# Altium schematic symbol library Regulator_Switching.SchLib: 1070 symbols (part 8 of 9) (continued)
## TPS62130A
designator *  value TPS62130A
ki_keywords: step-down dcdc; ki_description: 3A Step-Down Converter with DCS-Control, Adjustable Output Voltage, 3-17V Input Voltage, PG=LOW in Power-Down, QFN-16; ki_fp_filters: VQFN*1EP*3x3mm*P0.5mm*; Footprint: Package_DFN_QFN:VQFN-16-1EP_3x3mm_P0.5mm_EP1.68x1.68mm_ThermalVias; Supplier: http://www.ti.com/lit/ds/symlink/tps62130.pdf
footprint VQFN-16-1EP_3x3mm_P0.5mm_EP1.68x1.68mm_ThermalVias
pins: 1 SW (out), 2 SW hidden, 3 SW hidden, 4 PG (oc), 5 FB (in), 6 AGND (power), 7 FSW (in), 8 DEF (in), 9 SS/TR (in), 10 AVIN (power), 11 PVIN (power), 12 PVIN hidden, 13 EN (in), 14 VOS (in), 15 PGND (power), 16 PGND hidden, 17 EP (power)

## TPS62131
designator *  value TPS62131
ki_keywords: step-down dcdc; ki_description: 3A Step-Down Converter with DCS-Control, Fixed 1.8V Output Voltage, 3-17V Input Voltage, QFN-16; ki_fp_filters: VQFN*1EP*3x3mm*P0.5mm*; Footprint: Package_DFN_QFN:VQFN-16-1EP_3x3mm_P0.5mm_EP1.68x1.68mm_ThermalVias; Supplier: http://www.ti.com/lit/ds/symlink/tps62130.pdf
footprint VQFN-16-1EP_3x3mm_P0.5mm_EP1.68x1.68mm_ThermalVias
pins: 1 SW (out), 2 SW hidden, 3 SW hidden, 4 PG (oc), 5 FB (in), 6 AGND (power), 7 FSW (in), 8 DEF (in), 9 SS/TR (in), 10 AVIN (power), 11 PVIN (power), 12 PVIN hidden, 13 EN (in), 14 VOS (in), 15 PGND (power), 16 PGND hidden, 17 EP (power)

## TPS62132
designator *  value TPS62132
ki_keywords: step-down dcdc; ki_description: 3A Step-Down Converter with DCS-Control, Fixed 3.3V Output Voltage, 3-17V Input Voltage, QFN-16; ki_fp_filters: VQFN*1EP*3x3mm*P0.5mm*; Footprint: Package_DFN_QFN:VQFN-16-1EP_3x3mm_P0.5mm_EP1.68x1.68mm_ThermalVias; Supplier: http://www.ti.com/lit/ds/symlink/tps62130.pdf
footprint VQFN-16-1EP_3x3mm_P0.5mm_EP1.68x1.68mm_ThermalVias
pins: 1 SW (out), 2 SW hidden, 3 SW hidden, 4 PG (oc), 5 FB (in), 6 AGND (power), 7 FSW (in), 8 DEF (in), 9 SS/TR (in), 10 AVIN (power), 11 PVIN (power), 12 PVIN hidden, 13 EN (in), 14 VOS (in), 15 PGND (power), 16 PGND hidden, 17 EP (power)

## TPS62133
designator *  value TPS62133
ki_keywords: step-down dcdc; ki_description: 3A Step-Down Converter with DCS-Control, Fixed 5.0V Output Voltage, 3-17V Input Voltage, QFN-16; ki_fp_filters: VQFN*1EP*3x3mm*P0.5mm*; Footprint: Package_DFN_QFN:VQFN-16-1EP_3x3mm_P0.5mm_EP1.68x1.68mm_ThermalVias; Supplier: http://www.ti.com/lit/ds/symlink/tps62130.pdf
footprint VQFN-16-1EP_3x3mm_P0.5mm_EP1.68x1.68mm_ThermalVias
pins: 1 SW (out), 2 SW hidden, 3 SW hidden, 4 PG (oc), 5 FB (in), 6 AGND (power), 7 FSW (in), 8 DEF (in), 9 SS/TR (in), 10 AVIN (power), 11 PVIN (power), 12 PVIN hidden, 13 EN (in), 14 VOS (in), 15 PGND (power), 16 PGND hidden, 17 EP (power)

## TPS62140
designator *  value TPS62140
ki_keywords: step-down dcdc; ki_description: 2A Step-Down Converter with DCS-Control, Adjustable Output Voltage, 3-17V Input Voltage, QFN-16; ki_fp_filters: VQFN*1EP*3x3mm*P0.5mm*; Footprint: Package_DFN_QFN:VQFN-16-1EP_3x3mm_P0.5mm_EP1.68x1.68mm_ThermalVias; Supplier: http://www.ti.com/lit/ds/symlink/TPS62140.pdf
footprint VQFN-16-1EP_3x3mm_P0.5mm_EP1.68x1.68mm_ThermalVias
pins: 1 SW (out), 2 SW hidden, 3 SW hidden, 4 PG (oc), 5 FB (in), 6 AGND (power), 7 FSW (in), 8 DEF (in), 9 SS/TR (in), 10 AVIN (power), 11 PVIN (power), 12 PVIN hidden, 13 EN (in), 14 VOS (in), 15 PGND (power), 16 PGND hidden, 17 EP (power)

## TPS62140A
designator *  value TPS62140A
ki_keywords: step-down dcdc; ki_description: 2A Step-Down Converter with DCS-Control, Adjustable Output Voltage, 3-17V Input Voltage, PG=LOW in Power-Down, QFN-16; ki_fp_filters: VQFN*1EP*3x3mm*P0.5mm*; Footprint: Package_DFN_QFN:VQFN-16-1EP_3x3mm_P0.5mm_EP1.68x1.68mm_ThermalVias; Supplier: http://www.ti.com/lit/ds/symlink/TPS62140.pdf
footprint VQFN-16-1EP_3x3mm_P0.5mm_EP1.68x1.68mm_ThermalVias
pins: 1 SW (out), 2 SW hidden, 3 SW hidden, 4 PG (oc), 5 FB (in), 6 AGND (power), 7 FSW (in), 8 DEF (in), 9 SS/TR (in), 10 AVIN (power), 11 PVIN (power), 12 PVIN hidden, 13 EN (in), 14 VOS (in), 15 PGND (power), 16 PGND hidden, 17 EP (power)

## TPS62141
designator *  value TPS62141
ki_keywords: step-down dcdc; ki_description: 2A Step-Down Converter with DCS-Control, Fixed 1.8V Output Voltage, 3-17V Input Voltage, QFN-16; ki_fp_filters: VQFN*1EP*3x3mm*P0.5mm*; Footprint: Package_DFN_QFN:VQFN-16-1EP_3x3mm_P0.5mm_EP1.68x1.68mm_ThermalVias; Supplier: http://www.ti.com/lit/ds/symlink/TPS62140.pdf
footprint VQFN-16-1EP_3x3mm_P0.5mm_EP1.68x1.68mm_ThermalVias
pins: 1 SW (out), 2 SW hidden, 3 SW hidden, 4 PG (oc), 5 FB (in), 6 AGND (power), 7 FSW (in), 8 DEF (in), 9 SS/TR (in), 10 AVIN (power), 11 PVIN (power), 12 PVIN hidden, 13 EN (in), 14 VOS (in), 15 PGND (power), 16 PGND hidden, 17 EP (power)

## TPS62142
designator *  value TPS62142
ki_keywords: step-down dcdc; ki_description: 2A Step-Down Converter with DCS-Control, Fixed 3.3V Output Voltage, 3-17V Input Voltage, QFN-16; ki_fp_filters: VQFN*1EP*3x3mm*P0.5mm*; Footprint: Package_DFN_QFN:VQFN-16-1EP_3x3mm_P0.5mm_EP1.68x1.68mm_ThermalVias; Supplier: http://www.ti.com/lit/ds/symlink/TPS62140.pdf
footprint VQFN-16-1EP_3x3mm_P0.5mm_EP1.68x1.68mm_ThermalVias
pins: 1 SW (out), 2 SW hidden, 3 SW hidden, 4 PG (oc), 5 FB (in), 6 AGND (power), 7 FSW (in), 8 DEF (in), 9 SS/TR (in), 10 AVIN (power), 11 PVIN (power), 12 PVIN hidden, 13 EN (in), 14 VOS (in), 15 PGND (power), 16 PGND hidden, 17 EP (power)

## TPS62143
designator *  value TPS62143
ki_keywords: step-down dcdc; ki_description: 2A Step-Down Converter with DCS-Control, Fixed 5.0V Output Voltage, 3-17V Input Voltage, QFN-16; ki_fp_filters: VQFN*1EP*3x3mm*P0.5mm*; Footprint: Package_DFN_QFN:VQFN-16-1EP_3x3mm_P0.5mm_EP1.68x1.68mm_ThermalVias; Supplier: http://www.ti.com/lit/ds/symlink/TPS62140.pdf
footprint VQFN-16-1EP_3x3mm_P0.5mm_EP1.68x1.68mm_ThermalVias
pins: 1 SW (out), 2 SW hidden, 3 SW hidden, 4 PG (oc), 5 FB (in), 6 AGND (power), 7 FSW (in), 8 DEF (in), 9 SS/TR (in), 10 AVIN (power), 11 PVIN (power), 12 PVIN hidden, 13 EN (in), 14 VOS (in), 15 PGND (power), 16 PGND hidden, 17 EP (power)

## TPS62150
designator *  value TPS62150
ki_keywords: step-down dcdc; ki_description: 1A Step-Down Converter with DCS-Control, Adjustable Output Voltage, 3-17V Input Voltage, QFN-16; ki_fp_filters: VQFN*1EP*3x3mm*P0.5mm*; Footprint: Package_DFN_QFN:VQFN-16-1EP_3x3mm_P0.5mm_EP1.68x1.68mm_ThermalVias; Supplier: http://www.ti.com/lit/ds/symlink/TPS62150.pdf
footprint VQFN-16-1EP_3x3mm_P0.5mm_EP1.68x1.68mm_ThermalVias
pins: 1 SW (out), 2 SW hidden, 3 SW hidden, 4 PG (oc), 5 FB (in), 6 AGND (power), 7 FSW (in), 8 DEF (in), 9 SS/TR (in), 10 AVIN (power), 11 PVIN (power), 12 PVIN hidden, 13 EN (in), 14 VOS (in), 15 PGND (power), 16 PGND hidden, 17 EP (power)

## TPS62150A
designator *  value TPS62150A
ki_keywords: step-down dcdc; ki_description: 1A Step-Down Converter with DCS-Control, Adjustable Output Voltage, 3-17V Input Voltage, PG=LOW in Power-Down, QFN-16; ki_fp_filters: VQFN*1EP*3x3mm*P0.5mm*; Footprint: Package_DFN_QFN:VQFN-16-1EP_3x3mm_P0.5mm_EP1.68x1.68mm_ThermalVias; Supplier: http://www.ti.com/lit/ds/symlink/TPS62150.pdf
footprint VQFN-16-1EP_3x3mm_P0.5mm_EP1.68x1.68mm_ThermalVias
pins: 1 SW (out), 2 SW hidden, 3 SW hidden, 4 PG (oc), 5 FB (in), 6 AGND (power), 7 FSW (in), 8 DEF (in), 9 SS/TR (in), 10 AVIN (power), 11 PVIN (power), 12 PVIN hidden, 13 EN (in), 14 VOS (in), 15 PGND (power), 16 PGND hidden, 17 EP (power)

## TPS62151
designator *  value TPS62151
ki_keywords: step-down dcdc; ki_description: 1A Step-Down Converter with DCS-Control, Fixed 1.8V Output Voltage, 3-17V Input Voltage, QFN-16; ki_fp_filters: VQFN*1EP*3x3mm*P0.5mm*; Footprint: Package_DFN_QFN:VQFN-16-1EP_3x3mm_P0.5mm_EP1.68x1.68mm_ThermalVias; Supplier: http://www.ti.com/lit/ds/symlink/TPS62150.pdf
footprint VQFN-16-1EP_3x3mm_P0.5mm_EP1.68x1.68mm_ThermalVias
pins: 1 SW (out), 2 SW hidden, 3 SW hidden, 4 PG (oc), 5 FB (in), 6 AGND (power), 7 FSW (in), 8 DEF (in), 9 SS/TR (in), 10 AVIN (power), 11 PVIN (power), 12 PVIN hidden, 13 EN (in), 14 VOS (in), 15 PGND (power), 16 PGND hidden, 17 EP (power)

## TPS62152
designator *  value TPS62152
ki_keywords: step-down dcdc; ki_description: 1A Step-Down Converter with DCS-Control, Fixed 3.3V Output Voltage, 3-17V Input Voltage, QFN-16; ki_fp_filters: VQFN*1EP*3x3mm*P0.5mm*; Footprint: Package_DFN_QFN:VQFN-16-1EP_3x3mm_P0.5mm_EP1.68x1.68mm_ThermalVias; Supplier: http://www.ti.com/lit/ds/symlink/TPS62150.pdf
footprint VQFN-16-1EP_3x3mm_P0.5mm_EP1.68x1.68mm_ThermalVias
pins: 1 SW (out), 2 SW hidden, 3 SW hidden, 4 PG (oc), 5 FB (in), 6 AGND (power), 7 FSW (in), 8 DEF (in), 9 SS/TR (in), 10 AVIN (power), 11 PVIN (power), 12 PVIN hidden, 13 EN (in), 14 VOS (in), 15 PGND (power), 16 PGND hidden, 17 EP (power)

## TPS62153
designator *  value TPS62153
ki_keywords: step-down dcdc; ki_description: 1A Step-Down Converter with DCS-Control, Fixed 5.0V Output Voltage, 3-17V Input Voltage, QFN-16; ki_fp_filters: VQFN*1EP*3x3mm*P0.5mm*; Footprint: Package_DFN_QFN:VQFN-16-1EP_3x3mm_P0.5mm_EP1.68x1.68mm_ThermalVias; Supplier: http://www.ti.com/lit/ds/symlink/TPS62150.pdf
footprint VQFN-16-1EP_3x3mm_P0.5mm_EP1.68x1.68mm_ThermalVias
pins: 1 SW (out), 2 SW hidden, 3 SW hidden, 4 PG (oc), 5 FB (in), 6 AGND (power), 7 FSW (in), 8 DEF (in), 9 SS/TR (in), 10 AVIN (power), 11 PVIN (power), 12 PVIN hidden, 13 EN (in), 14 VOS (in), 15 PGND (power), 16 PGND hidden, 17 EP (power)

## TPS62160DGK
designator *  value TPS62160DGK
ki_keywords: step-down dc-dc buck regulator; ki_description: 1A Step-Down Converter with DCS-Control, adjustable output, 3-17V input voltage, VSSOP-8; ki_fp_filters: MSOP*3x3mm*P0.65mm*; Footprint: Package_SO:MSOP-8_3x3mm_P0.65mm; Supplier: http://www.ti.com/lit/ds/symlink/tps62160.pdf
footprint MSOP-8_3x3mm_P0.65mm
pins: 1 PGND (power), 2 VIN (power), 3 EN (in), 4 AGND (power), 5 FB (in), 6 VOS (in), 7 SW (out), 8 PG (oc)

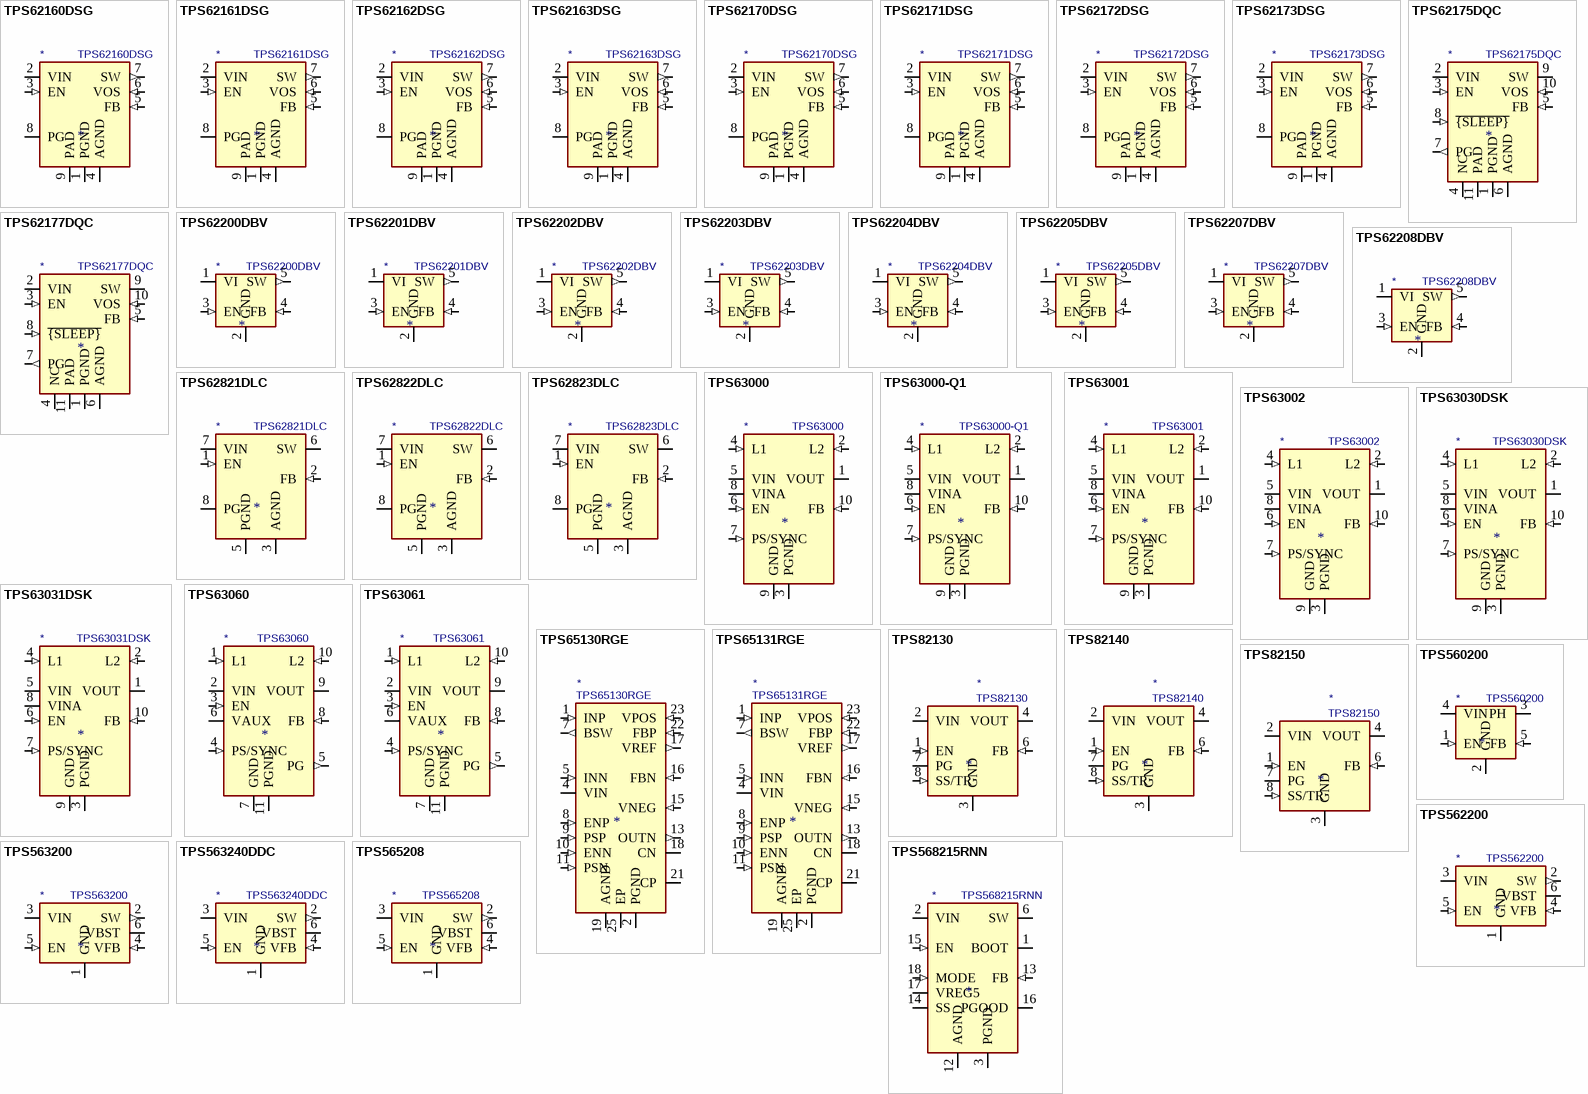
[diagram p25: symbols TPS62160DSG to TPS568215RNN]

## TPS62160DSG
designator *  value TPS62160DSG
ki_keywords: step-down dc-dc buck regulator; ki_description: 1A Step-Down Converter with DCS-Control, adjustable output, 3-17V input voltage, WSON-8; ki_fp_filters: WSON*EP*2x2mm*P0.5mm*; Footprint: Package_SON:WSON-8-1EP_2x2mm_P0.5mm_EP0.9x1.6mm_ThermalVias; Supplier: http://www.ti.com/lit/ds/symlink/tps62160.pdf
footprint WSON-8-1EP_2x2mm_P0.5mm_EP0.9x1.6mm_ThermalVias
pins: 1 PGND (power), 2 VIN (power), 3 EN (in), 4 AGND (power), 5 FB (in), 6 VOS (in), 7 SW (out), 8 PG (oc), 9 PAD (power)

## TPS62161DSG
designator *  value TPS62161DSG
ki_keywords: step-down dc-dc buck regulator; ki_description: 1A Step-Down Converter with DCS-Control, fixed 1.8V output, 3-17V input voltage, WSON-8; ki_fp_filters: WSON*EP*2x2mm*P0.5mm*; Footprint: Package_SON:WSON-8-1EP_2x2mm_P0.5mm_EP0.9x1.6mm_ThermalVias; Supplier: http://www.ti.com/lit/ds/symlink/tps62160.pdf
footprint WSON-8-1EP_2x2mm_P0.5mm_EP0.9x1.6mm_ThermalVias
pins: 1 PGND (power), 2 VIN (power), 3 EN (in), 4 AGND (power), 5 FB (in), 6 VOS (in), 7 SW (out), 8 PG (oc), 9 PAD (power)

## TPS62162DSG
designator *  value TPS62162DSG
ki_keywords: step-down dc-dc buck regulator; ki_description: 1A Step-Down Converter with DCS-Control, fixed 3.3V output, 3-17V input voltage, WSON-8; ki_fp_filters: WSON*EP*2x2mm*P0.5mm*; Footprint: Package_SON:WSON-8-1EP_2x2mm_P0.5mm_EP0.9x1.6mm_ThermalVias; Supplier: http://www.ti.com/lit/ds/symlink/tps62160.pdf
footprint WSON-8-1EP_2x2mm_P0.5mm_EP0.9x1.6mm_ThermalVias
pins: 1 PGND (power), 2 VIN (power), 3 EN (in), 4 AGND (power), 5 FB (in), 6 VOS (in), 7 SW (out), 8 PG (oc), 9 PAD (power)

## TPS62163DSG
designator *  value TPS62163DSG
ki_keywords: step-down dc-dc buck regulator; ki_description: 1A Step-Down Converter with DCS-Control, fixed 5.0V output, 3-17V input voltage, WSON-8; ki_fp_filters: WSON*EP*2x2mm*P0.5mm*; Footprint: Package_SON:WSON-8-1EP_2x2mm_P0.5mm_EP0.9x1.6mm_ThermalVias; Supplier: http://www.ti.com/lit/ds/symlink/tps62160.pdf
footprint WSON-8-1EP_2x2mm_P0.5mm_EP0.9x1.6mm_ThermalVias
pins: 1 PGND (power), 2 VIN (power), 3 EN (in), 4 AGND (power), 5 FB (in), 6 VOS (in), 7 SW (out), 8 PG (oc), 9 PAD (power)

## TPS62170DSG
designator *  value TPS62170DSG
ki_keywords: step-down dc-dc buck regulator; ki_description: 500mA Step-Down Converter with DCS-Control, adjustable output, 3-17V input voltage, WSON-8; ki_fp_filters: WSON*EP*2x2mm*P0.5mm*; Footprint: Package_SON:WSON-8-1EP_2x2mm_P0.5mm_EP0.9x1.6mm_ThermalVias; Supplier: http://www.ti.com/lit/ds/symlink/tps62170.pdf
footprint WSON-8-1EP_2x2mm_P0.5mm_EP0.9x1.6mm_ThermalVias
pins: 1 PGND (power), 2 VIN (power), 3 EN (in), 4 AGND (power), 5 FB (in), 6 VOS (in), 7 SW (out), 8 PG (oc), 9 PAD (power)

## TPS62171DSG
designator *  value TPS62171DSG
ki_keywords: step-down dc-dc buck regulator; ki_description: 500mA Step-Down Converter with DCS-Control, fixed 1.8V output, 3-17V input voltage, WSON-8; ki_fp_filters: WSON*EP*2x2mm*P0.5mm*; Footprint: Package_SON:WSON-8-1EP_2x2mm_P0.5mm_EP0.9x1.6mm_ThermalVias; Supplier: http://www.ti.com/lit/ds/symlink/tps62170.pdf
footprint WSON-8-1EP_2x2mm_P0.5mm_EP0.9x1.6mm_ThermalVias
pins: 1 PGND (power), 2 VIN (power), 3 EN (in), 4 AGND (power), 5 FB (in), 6 VOS (in), 7 SW (out), 8 PG (oc), 9 PAD (power)

## TPS62172DSG
designator *  value TPS62172DSG
ki_keywords: step-down dc-dc buck regulator; ki_description: 500mA Step-Down Converter with DCS-Control, fixed 3.3V output, 3-17V input voltage, WSON-8; ki_fp_filters: WSON*EP*2x2mm*P0.5mm*; Footprint: Package_SON:WSON-8-1EP_2x2mm_P0.5mm_EP0.9x1.6mm_ThermalVias; Supplier: http://www.ti.com/lit/ds/symlink/tps62170.pdf
footprint WSON-8-1EP_2x2mm_P0.5mm_EP0.9x1.6mm_ThermalVias
pins: 1 PGND (power), 2 VIN (power), 3 EN (in), 4 AGND (power), 5 FB (in), 6 VOS (in), 7 SW (out), 8 PG (oc), 9 PAD (power)

## TPS62173DSG
designator *  value TPS62173DSG
ki_keywords: step-down dc-dc buck regulator; ki_description: 500mA Step-Down Converter with DCS-Control, fixed 5.0V output, 3-17V input voltage, WSON-8; ki_fp_filters: WSON*EP*2x2mm*P0.5mm*; Footprint: Package_SON:WSON-8-1EP_2x2mm_P0.5mm_EP0.9x1.6mm_ThermalVias; Supplier: http://www.ti.com/lit/ds/symlink/tps62170.pdf
footprint WSON-8-1EP_2x2mm_P0.5mm_EP0.9x1.6mm_ThermalVias
pins: 1 PGND (power), 2 VIN (power), 3 EN (in), 4 AGND (power), 5 FB (in), 6 VOS (in), 7 SW (out), 8 PG (oc), 9 PAD (power)

## TPS62175DQC
designator *  value TPS62175DQC
ki_keywords: step-down dc-dc buck regulator; ki_description: 500mA Step-Down Converter with Sleep Mode, adjustable Output Voltage, 4.75-28V input voltage, WSON-10; ki_fp_filters: WSON*EP*2x3mm*P0.5mm*; Footprint: Package_SON:WSON-10-1EP_2x3mm_P0.5mm_EP0.84x2.4mm_ThermalVias; Supplier: http://www.ti.com/lit/ds/symlink/tps62177.pdf
footprint WSON-10-1EP_2x3mm_P0.5mm_EP0.84x2.4mm_ThermalVias
pins: 1 PGND (power), 2 VIN (power), 3 EN (in), 4 NC, 5 FB (in), 6 AGND (power), 7 PG (out), 8 ~{{SLEEP}} (in), 9 SW (power), 10 VOS (in), 11 PAD (power)

## TPS62177DQC
designator *  value TPS62177DQC
ki_keywords: step-down dc-dc buck regulator; ki_description: 500mA Step-Down Converter with Sleep Mode, fixed 3.3V Output Voltage, 4.75-28V input voltage, WSON-10; ki_fp_filters: WSON*EP*2x3mm*P0.5mm*; Footprint: Package_SON:WSON-10-1EP_2x3mm_P0.5mm_EP0.84x2.4mm_ThermalVias; Supplier: http://www.ti.com/lit/ds/symlink/tps62177.pdf
footprint WSON-10-1EP_2x3mm_P0.5mm_EP0.84x2.4mm_ThermalVias
pins: 1 PGND (power), 2 VIN (power), 3 EN (in), 4 NC, 5 FB (in), 6 AGND (power), 7 PG (out), 8 ~{{SLEEP}} (in), 9 SW (power), 10 VOS (in), 11 PAD (power)

## TPS62200DBV
designator *  value TPS62200DBV
ki_keywords: Step-Down DC-DC Converter; ki_description: 300mA High-Efficiency Step-Down DC-DC Converter, adjustable output voltage, 2.5-6V input voltage, SOT-23-5; ki_fp_filters: SOT?23*; Footprint: Package_TO_SOT_SMD:SOT-23-5; Supplier: http://www.ti.com/lit/ds/symlink/tps62201.pdf
footprint SOT-23-5
pins: 1 VI (power), 2 GND (power), 3 EN (in), 4 FB (in), 5 SW (out)

## TPS62201DBV
designator *  value TPS62201DBV
ki_keywords: Step-Down DC-DC Converter; ki_description: 300mA High-Efficiency Step-Down DC-DC Converter, fixed 1.5V output voltage, 2.5-6V input voltage, SOT-23-5; ki_fp_filters: SOT?23*; Footprint: Package_TO_SOT_SMD:SOT-23-5; Supplier: http://www.ti.com/lit/ds/symlink/tps62201.pdf
footprint SOT-23-5
pins: 1 VI (power), 2 GND (power), 3 EN (in), 4 FB (in), 5 SW (out)

## TPS62202DBV
designator *  value TPS62202DBV
ki_keywords: Step-Down DC-DC Converter; ki_description: 300mA High-Efficiency Step-Down DC-DC Converter, fixed 1.8V output voltage, 2.5-6V input voltage, SOT-23-5; ki_fp_filters: SOT?23*; Footprint: Package_TO_SOT_SMD:SOT-23-5; Supplier: http://www.ti.com/lit/ds/symlink/tps62201.pdf
footprint SOT-23-5
pins: 1 VI (power), 2 GND (power), 3 EN (in), 4 FB (in), 5 SW (out)

## TPS62203DBV
designator *  value TPS62203DBV
ki_keywords: Step-Down DC-DC Converter; ki_description: 300mA High-Efficiency Step-Down DC-DC Converter, fixed 3.3V output voltage, 2.5-6V input voltage, SOT-23-5; ki_fp_filters: SOT?23*; Footprint: Package_TO_SOT_SMD:SOT-23-5; Supplier: http://www.ti.com/lit/ds/symlink/tps62201.pdf
footprint SOT-23-5
pins: 1 VI (power), 2 GND (power), 3 EN (in), 4 FB (in), 5 SW (out)

## TPS62204DBV
designator *  value TPS62204DBV
ki_keywords: Step-Down DC-DC Converter; ki_description: 300mA High-Efficiency Step-Down DC-DC Converter, fixed 1.6V output voltage, 2.5-6V input voltage, SOT-23-5; ki_fp_filters: SOT?23*; Footprint: Package_TO_SOT_SMD:SOT-23-5; Supplier: http://www.ti.com/lit/ds/symlink/tps62201.pdf
footprint SOT-23-5
pins: 1 VI (power), 2 GND (power), 3 EN (in), 4 FB (in), 5 SW (out)

## TPS62205DBV
designator *  value TPS62205DBV
ki_keywords: Step-Down DC-DC Converter; ki_description: 300mA High-Efficiency Step-Down DC-DC Converter, fixed 2.5V output voltage, 2.5-6V input voltage, SOT-23-5; ki_fp_filters: SOT?23*; Footprint: Package_TO_SOT_SMD:SOT-23-5; Supplier: http://www.ti.com/lit/ds/symlink/tps62201.pdf
footprint SOT-23-5
pins: 1 VI (power), 2 GND (power), 3 EN (in), 4 FB (in), 5 SW (out)

## TPS62207DBV
designator *  value TPS62207DBV
ki_keywords: Step-Down DC-DC Converter; ki_description: 300mA High-Efficiency Step-Down DC-DC Converter, fixed 1.2V output voltage, 2.5-6V input voltage, SOT-23-5; ki_fp_filters: SOT?23*; Footprint: Package_TO_SOT_SMD:SOT-23-5; Supplier: http://www.ti.com/lit/ds/symlink/tps62201.pdf
footprint SOT-23-5
pins: 1 VI (power), 2 GND (power), 3 EN (in), 4 FB (in), 5 SW (out)

## TPS62208DBV
designator *  value TPS62208DBV
ki_keywords: Step-Down DC-DC Converter; ki_description: 300mA High-Efficiency Step-Down DC-DC Converter, fixed 1.875V output voltage, 2.5-6V input voltage, SOT-23-5; ki_fp_filters: SOT?23*; Footprint: Package_TO_SOT_SMD:SOT-23-5; Supplier: http://www.ti.com/lit/ds/symlink/tps62201.pdf
footprint SOT-23-5
pins: 1 VI (power), 2 GND (power), 3 EN (in), 4 FB (in), 5 SW (out)

## TPS62821DLC
designator *  value TPS62821DLC
ki_keywords: step-down dc-dc buck regulator; ki_description: 1A Step-Down Converter with DCS-Control, adjustable output, 2.4-5.5V input voltage, QFN-8; ki_fp_filters: Texas*VSON*HR*1.5x2mm*P0.5mm*; Footprint: Package_DFN_QFN:Texas_VSON-HR-8_1.5x2mm_P0.5mm; Supplier: http://www.ti.com/lit/ds/symlink/tps62823.pdf
footprint Texas_VSON-HR-8_1.5x2mm_P0.5mm
pins: 1 EN (in), 2 FB (in), 3 AGND (power), 4 NC (in) hidden, 5 PGND (power), 6 SW (power), 7 VIN (power), 8 PG (oc)

## TPS62822DLC
designator *  value TPS62822DLC
ki_keywords: step-down dc-dc buck regulator; ki_description: 2A Step-Down Converter with DCS-Control, adjustable output, 2.4-5.5V input voltage, QFN-8; ki_fp_filters: Texas*VSON*HR*1.5x2mm*P0.5mm*; Footprint: Package_DFN_QFN:Texas_VSON-HR-8_1.5x2mm_P0.5mm; Supplier: http://www.ti.com/lit/ds/symlink/tps62823.pdf
footprint Texas_VSON-HR-8_1.5x2mm_P0.5mm
pins: 1 EN (in), 2 FB (in), 3 AGND (power), 4 NC (in) hidden, 5 PGND (power), 6 SW (power), 7 VIN (power), 8 PG (oc)

## TPS62823DLC
designator *  value TPS62823DLC
ki_keywords: step-down dc-dc buck regulator; ki_description: 3A Step-Down Converter with DCS-Control, adjustable output, 2.4-5.5V input voltage, QFN-8; ki_fp_filters: Texas*VSON*HR*1.5x2mm*P0.5mm*; Footprint: Package_DFN_QFN:Texas_VSON-HR-8_1.5x2mm_P0.5mm; Supplier: http://www.ti.com/lit/ds/symlink/tps62823.pdf
footprint Texas_VSON-HR-8_1.5x2mm_P0.5mm
pins: 1 EN (in), 2 FB (in), 3 AGND (power), 4 NC (in) hidden, 5 PGND (power), 6 SW (power), 7 VIN (power), 8 PG (oc)

## TPS63000
designator *  value TPS63000
ki_keywords: Buck-Boost adjustable converter; ki_description: Buck-Boost Converter, 1.8-5.5V Input Voltage, 1.8A Switch Current, Adjustable 1.2-5.5V Output Voltage, VSON-10; ki_fp_filters: Texas*DRC0010J*; Footprint: Package_SON:Texas_DRC0010J_ThermalVias; Supplier: http://www.ti.com/lit/ds/symlink/tps63000.pdf
footprint Texas_DRC0010J_ThermalVias
pins: 1 VOUT (power), 2 L2 (in), 3 PGND (power), 4 L1 (in), 5 VIN (power), 6 EN (in), 7 PS/SYNC (in), 8 VINA (power), 9 GND (power), 10 FB (in), 11 PGND hidden

## TPS63000-Q1
designator *  value TPS63000-Q1
ki_keywords: Buck-Boost adjustable converter; ki_description: Buck-Boost Converter, 1.8-5.5V Input Voltage, 1.8A Switch Current, Adjustable 1.2-5.5V Output Voltage, Automotive, VSON-10; ki_fp_filters: Texas*DRC0010J*; Footprint: Package_SON:Texas_DRC0010J_ThermalVias; Supplier: http://www.ti.com/lit/ds/symlink/tps63000-q1.pdf
footprint Texas_DRC0010J_ThermalVias
pins: 1 VOUT (power), 2 L2 (in), 3 PGND (power), 4 L1 (in), 5 VIN (power), 6 EN (in), 7 PS/SYNC (in), 8 VINA (power), 9 GND (power), 10 FB (in), 11 PGND hidden

## TPS63001
designator *  value TPS63001
ki_keywords: Buck-Boost fixed 3.3V converter; ki_description: Buck-Boost Converter, 1.8-5.5V Input Voltage, 1.7A Switch Current, 3.3V Output Voltage, VSON-10; ki_fp_filters: Texas*DRC0010J*; Footprint: Package_SON:Texas_DRC0010J_ThermalVias; Supplier: http://www.ti.com/lit/ds/symlink/tps63000.pdf
footprint Texas_DRC0010J_ThermalVias
pins: 1 VOUT (power), 2 L2 (in), 3 PGND (power), 4 L1 (in), 5 VIN (power), 6 EN (in), 7 PS/SYNC (in), 8 VINA (power), 9 GND (power), 10 FB (in), 11 PGND hidden

## TPS63002
designator *  value TPS63002
ki_keywords: Buck-Boost fixed 5V converter; ki_description: Buck-Boost Converter, 1.8-5.5V Input Voltage, 1.7A Switch Current, 5V Output Voltage, VSON-10; ki_fp_filters: Texas*DRC0010J*; Footprint: Package_SON:Texas_DRC0010J_ThermalVias; Supplier: http://www.ti.com/lit/ds/symlink/tps63000.pdf
footprint Texas_DRC0010J_ThermalVias
pins: 1 VOUT (power), 2 L2 (in), 3 PGND (power), 4 L1 (in), 5 VIN (power), 6 EN (in), 7 PS/SYNC (in), 8 VINA (power), 9 GND (power), 10 FB (in), 11 PGND hidden

## TPS63030DSK
designator *  value TPS63030DSK
ki_keywords: Buck-Boost adjustable converter; ki_description: Buck-Boost Converter, 1.8-5.5V Input Voltage, 1A Switch Current, Adjustable Output Voltage, VSON-10 (DSK0010A); ki_fp_filters: WSON*1EP*2.5x2.5mm*P0.5mm*EP1.2x2mm*; Footprint: Package_SON:WSON-10-1EP_2.5x2.5mm_P0.5mm_EP1.2x2mm; Supplier: http://www.ti.com/lit/ds/symlink/tps63030.pdf
footprint WSON-10-1EP_2.5x2.5mm_P0.5mm_EP1.2x2mm
pins: 1 VOUT (power), 2 L2 (in), 3 PGND (power), 4 L1 (in), 5 VIN (power), 6 EN (in), 7 PS/SYNC (in), 8 VINA, 9 GND (power), 10 FB (in), 11 PGND hidden

## TPS63031DSK
designator *  value TPS63031DSK
ki_keywords: Buck-Boost fixed 3.3V converter; ki_description: Buck-Boost Converter, 1.8-5.5V Input Voltage, 1A Switch Current, 3.3V Output Voltage, VSON-10 (DSK0010A); ki_fp_filters: WSON*1EP*2.5x2.5mm*P0.5mm*EP1.2x2mm*; Footprint: Package_SON:WSON-10-1EP_2.5x2.5mm_P0.5mm_EP1.2x2mm; Supplier: http://www.ti.com/lit/ds/symlink/tps63031.pdf
footprint WSON-10-1EP_2.5x2.5mm_P0.5mm_EP1.2x2mm
pins: 1 VOUT (power), 2 L2 (in), 3 PGND (power), 4 L1 (in), 5 VIN (power), 6 EN (in), 7 PS/SYNC (in), 8 VINA, 9 GND (power), 10 FB (in), 11 PGND hidden

## TPS63060
designator *  value TPS63060
ki_keywords: Buck-Boost adjustable converter; ki_description: Buck-Boost Converter, 2.5-12V Input Voltage, 2-A Switch Current, Adjustable 2.5-8V Output Voltage, S-PWSON-N10; ki_fp_filters: Texas*S*PWSON*N10*; Footprint: Package_SON:Texas_S-PWSON-N10_ThermalVias; Supplier: http://www.ti.com/lit/ds/symlink/tps63060.pdf
footprint Texas_S-PWSON-N10_ThermalVias
pins: 1 L1 (in), 2 VIN (power), 3 EN (in), 4 PS/SYNC (in), 5 PG (out), 6 VAUX, 7 GND (power), 8 FB (in), 9 VOUT (power), 10 L2 (in), 11 PGND (power)

## TPS63061
designator *  value TPS63061
ki_keywords: Buck-Boost converter 5V; ki_description: Buck-Boost Converter, 2.5-12V Input Voltage, 2-A Switch Current, Fixed 5V Output Voltage, S-PWSON-10; ki_fp_filters: Texas*S*PWSON*N10*; Footprint: Package_SON:Texas_S-PWSON-N10_ThermalVias; Supplier: http://www.ti.com/lit/ds/symlink/tps63060.pdf
footprint Texas_S-PWSON-N10_ThermalVias
pins: 1 L1 (in), 2 VIN (power), 3 EN (in), 4 PS/SYNC (in), 5 PG (out), 6 VAUX, 7 GND (power), 8 FB (in), 9 VOUT (power), 10 L2 (in), 11 PGND (power)

## TPS65130RGE
designator *  value TPS65130RGE
ki_keywords: split-rail switching dual positive negative; ki_description: Split-Rail Converter with Dual, Positive and Negative Outputs (300mA typ, Switch Current Limit 800mA typ), 2.7-5.5V, VQFN-24; ki_fp_filters: VQFN*1EP*4x4mm*P0.5mm*; Footprint: Package_DFN_QFN:VQFN-24-1EP_4x4mm_P0.5mm_EP2.45x2.45mm_ThermalVias; Supplier: http://www.ti.com/lit/ds/symlink/tps65130.pdf
footprint VQFN-24-1EP_4x4mm_P0.5mm_EP2.45x2.45mm_ThermalVias
pins: 1 INP (in), 2 PGND (power), 3 PGND hidden, 4 VIN (power), 5 INN (in), 6 INN (in) hidden, 7 BSW (out), 8 ENP (in), 9 PSP (in), 10 ENN (in), 11 PSN (in), 12 NC (in) hidden, 13 OUTN (out), 14 OUTN hidden, 15 VNEG (in), 16 FBN (in), 17 VREF (out), 18 CN, 19 AGND (power), 20 NC (in) hidden, 21 CP, 22 FBP (in), 23 VPOS (in), 24 INP (in) hidden, 25 EP

## TPS65131RGE
designator *  value TPS65131RGE
ki_keywords: split-rail switching dual positive negative; ki_description: Split-Rail Converter with Dual, Positive and Negative Outputs (750mA typ, Switch Current Limit 1950mA typ),), 2.7-5.5V, VQFN-24; ki_fp_filters: VQFN*1EP*4x4mm*P0.5mm*; Footprint: Package_DFN_QFN:VQFN-24-1EP_4x4mm_P0.5mm_EP2.45x2.45mm_ThermalVias; Supplier: http://www.ti.com/lit/ds/symlink/tps65130.pdf
footprint VQFN-24-1EP_4x4mm_P0.5mm_EP2.45x2.45mm_ThermalVias
pins: 1 INP (in), 2 PGND (power), 3 PGND hidden, 4 VIN (power), 5 INN (in), 6 INN (in) hidden, 7 BSW (out), 8 ENP (in), 9 PSP (in), 10 ENN (in), 11 PSN (in), 12 NC (in) hidden, 13 OUTN (out), 14 OUTN hidden, 15 VNEG (in), 16 FBN (in), 17 VREF (out), 18 CN, 19 AGND (power), 20 NC (in) hidden, 21 CP, 22 FBP (in), 23 VPOS (in), 24 INP (in) hidden, 25 EP

## TPS82130
designator *  value TPS82130
ki_keywords: 17V 3A Step-down Buck Module; ki_description: 17V Input 3A Step-Down Converter MicroSiP Module with Integrated Inductor, μSiL-8; ki_fp_filters: Texas*MicroSiP*1EP*2.8x3.0mm*P0.65mm*; Footprint: Package_LGA:Texas_MicroSiP-8-1EP_2.8x3.0mm_P0.65mm_EP1.1x1.9mm_SMD_ThermalVias; Supplier: http://www.ti.com/lit/ds/symlink/tps82130.pdf
footprint Texas_MicroSiP-8-1EP_2.8x3.0mm_P0.65mm_EP1.1x1.9mm_SMD_ThermalVias
pins: 1 EN (in), 2 VIN (power), 3 GND (power), 4 VOUT (power), 5 VOUT hidden, 6 FB (in), 7 PG (oc), 8 SS/TR (in), 9 GND hidden

## TPS82140
designator *  value TPS82140
ki_keywords: 17V 2A Step-down Buck Module; ki_description: 17V Input 2A Step-Down Converter MicroSiP Module with Integrated Inductor, μSiL-8; ki_fp_filters: Texas*MicroSiP*1EP*2.8x3.0mm*P0.65mm*; Footprint: Package_LGA:Texas_MicroSiP-8-1EP_2.8x3.0mm_P0.65mm_EP1.1x1.9mm_SMD_ThermalVias; Supplier: http://www.ti.com/lit/ds/symlink/tps82140.pdf
footprint Texas_MicroSiP-8-1EP_2.8x3.0mm_P0.65mm_EP1.1x1.9mm_SMD_ThermalVias
pins: 1 EN (in), 2 VIN (power), 3 GND (power), 4 VOUT (power), 5 VOUT hidden, 6 FB (in), 7 PG (oc), 8 SS/TR (in), 9 GND hidden

## TPS82150
designator *  value TPS82150
ki_keywords: 17V 1A Step-down Buck Module; ki_description: 17V Input 1A Step-Down Converter MicroSiP Module with Integrated Inductor, μSiL-8; ki_fp_filters: Texas*MicroSiP*1EP*2.8x3.0mm*P0.65mm*; Footprint: Package_LGA:Texas_MicroSiP-8-1EP_2.8x3.0mm_P0.65mm_EP1.1x1.9mm_SMD_ThermalVias; Supplier: http://www.ti.com/lit/ds/symlink/tps82150.pdf
footprint Texas_MicroSiP-8-1EP_2.8x3.0mm_P0.65mm_EP1.1x1.9mm_SMD_ThermalVias
pins: 1 EN (in), 2 VIN (power), 3 GND (power), 4 VOUT (power), 5 VOUT hidden, 6 FB (in), 7 PG (oc), 8 SS/TR (in), 9 GND hidden

## TPS560200
designator *  value TPS560200
ki_keywords: Voltage regulator switching buck fixed output analog; ki_description: 500mA, Synchronous Step-Down Converter With, Adjustable Output Voltage, 4.5-17V Input Voltage, SOT-23-5; ki_fp_filters: SOT?23*; Footprint: Package_TO_SOT_SMD:SOT-23-5; Supplier: http://www.ti.com/lit/ds/symlink/tps560200.pdf
footprint SOT-23-5
pins: 1 EN (in), 2 GND (power), 3 PH (power), 4 VIN (power), 5 FB (in)

## TPS562200
designator *  value TPS562200
ki_keywords: step-down dcdc voltage regulator; ki_description: 2A Synchronous Step-Down Voltage Regulator, Adjustable Output Voltage, 4.5-17V Input Voltage, SOT-23-6; ki_fp_filters: SOT?23*; Footprint: Package_TO_SOT_SMD:SOT-23-6; Supplier: http://www.ti.com/lit/ds/symlink/tps563200.pdf
footprint SOT-23-6
pins: 1 GND (power), 2 SW (out), 3 VIN (power), 4 VFB (in), 5 EN (in), 6 VBST

## TPS563200
designator *  value TPS563200
ki_keywords: step-down dcdc voltage regulator; ki_description: 3A Synchronous Step-Down Voltage Regulator, Adjustable Output Voltage, 4.5-17V Input Voltage, SOT-23-6; ki_fp_filters: SOT?23*; Footprint: Package_TO_SOT_SMD:SOT-23-6; Supplier: http://www.ti.com/lit/ds/symlink/tps563200.pdf
footprint SOT-23-6
pins: 1 GND (power), 2 SW (out), 3 VIN (power), 4 VFB (in), 5 EN (in), 6 VBST

## TPS563240DDC
designator *  value TPS563240DDC
ki_keywords: step-down dcdc voltage regulator; ki_description: 3A Synchronous Step-Down Voltage Regulator, Adjustable Output Voltage, 4.5-17V Input Voltage, SOT-23-6; ki_fp_filters: SOT?23*; Footprint: Package_TO_SOT_SMD:SOT-23-6; Supplier: www.ti.com/lit/ds/symlink/tps563240.pdf
footprint SOT-23-6
pins: 1 GND (power), 2 SW (out), 3 VIN (power), 4 VFB (in), 5 EN (in), 6 VBST

## TPS565208
designator *  value TPS565208
ki_keywords: step-down dcdc voltage regulator; ki_description: 5A Synchronous Step-Down Voltage Regulator, Adjustable Output Voltage, 4.5-17V Input Voltage, SOT-23-6; ki_fp_filters: SOT?23*; Footprint: Package_TO_SOT_SMD:SOT-23-6; Supplier: http://www.ti.com/lit/ds/symlink/tps565208.pdf
footprint SOT-23-6
pins: 1 GND (power), 2 SW (out), 3 VIN (power), 4 VFB (in), 5 EN (in), 6 VBST

## TPS568215RNN
designator *  value TPS568215RNN
ki_keywords: switching buck converter step-down; ki_description: 4.5V-17V Input, 8A Synchronous Step-Down SWIFT Converter, Adjustable Output, 400kHz/800kHz/1.2MHz Switching Frequency, Texas VQFN-18; ki_fp_filters: Texas*RNN0018A*; Footprint: Package_DFN_QFN:Texas_RNN0018A; Supplier: http://www.ti.com/lit/ds/symlink/tps568215.pdf
footprint Texas_RNN0018A
pins: 1 BOOT, 2 VIN (power), 3 PGND (power), 4 PGND hidden, 5 PGND hidden, 6 SW (power), 7 SW hidden, 8 PGND hidden, 9 PGND hidden, 10 PGND hidden, 11 VIN hidden, 12 AGND (power), 13 FB (in), 14 SS, 15 EN (in), 16 PGOOD (oc), 17 VREG5, 18 MODE (in)

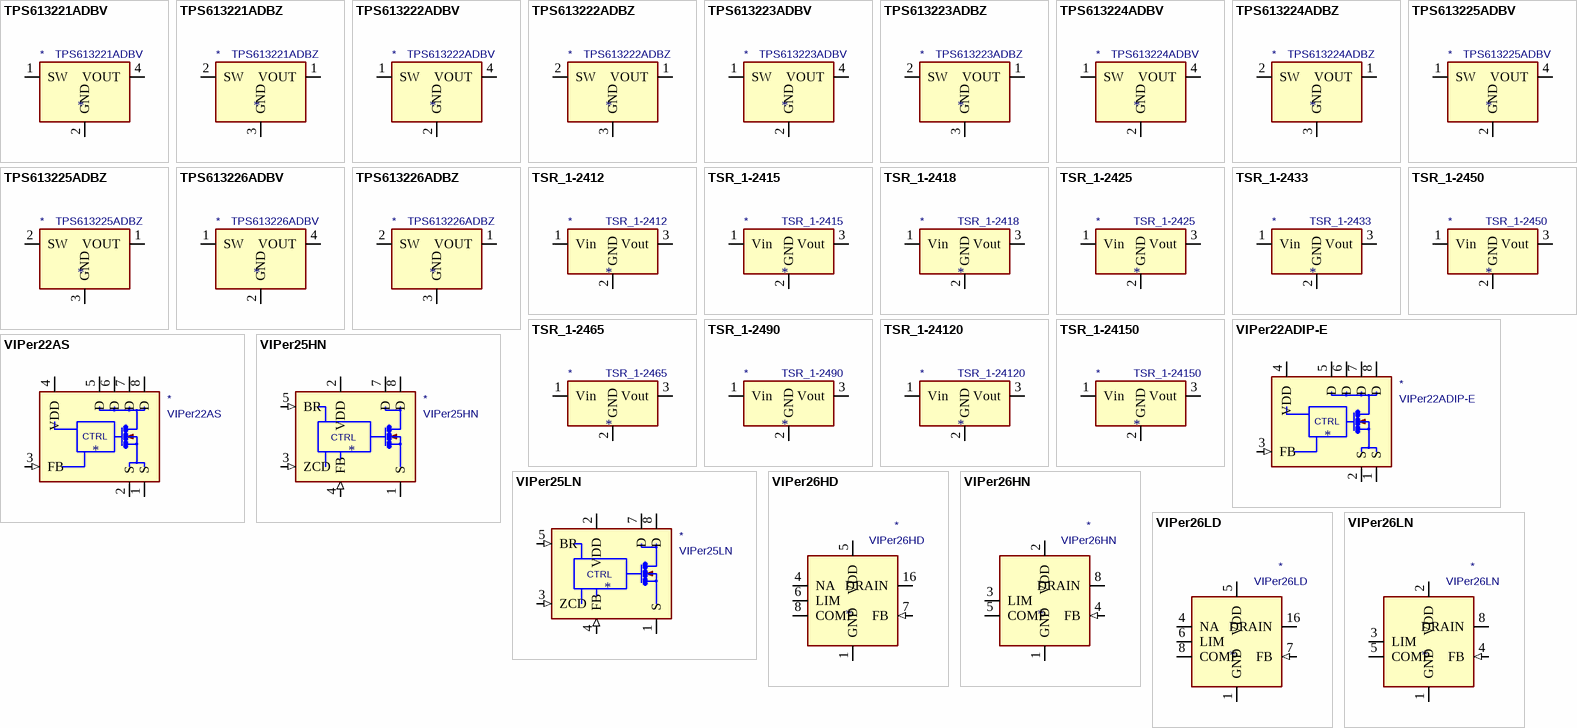
[diagram p26: symbols TPS613221ADBV to VIPer26LN]

## TPS613221ADBV
designator *  value TPS613221ADBV
ki_keywords: Boost converter; ki_description: 1.2A Step-Up Converter, 3.3V Output Voltage, 0.9-5.5V Input Voltage, SOT-23-5; ki_fp_filters: SOT?23*; Footprint: Package_TO_SOT_SMD:SOT-23-5; Supplier: http://www.ti.com/lit/ds/symlink/tps61322.pdf
footprint SOT-23-5
pins: 1 SW (power), 2 GND (power), 3 NC (in) hidden, 4 VOUT (power), 5 NC (in) hidden

## TPS613221ADBZ
designator *  value TPS613221ADBZ
ki_keywords: Boost converter; ki_description: 1.2A Step-Up Converter, 3.3V Output Voltage, 0.9-5.5V Input Voltage, SOT-23; ki_fp_filters: SOT?23*; Footprint: Package_TO_SOT_SMD:SOT-23; Supplier: http://www.ti.com/lit/ds/symlink/tps61322.pdf
footprint SOT-23
pins: 1 VOUT (power), 2 SW (power), 3 GND (power)

## TPS613222ADBV
designator *  value TPS613222ADBV
ki_keywords: Boost converter; ki_description: 1.8A Step-Up Converter, 5V Output Voltage, 0.9-5.5V Input Voltage, SOT-23-5; ki_fp_filters: SOT?23*; Footprint: Package_TO_SOT_SMD:SOT-23-5; Supplier: http://www.ti.com/lit/ds/symlink/tps61322.pdf
footprint SOT-23-5
pins: 1 SW (power), 2 GND (power), 3 NC (in) hidden, 4 VOUT (power), 5 NC (in) hidden

## TPS613222ADBZ
designator *  value TPS613222ADBZ
ki_keywords: Boost converter; ki_description: 1.8A Step-Up Converter, 5V Output Voltage, 0.9-5.5V Input Voltage, SOT-23; ki_fp_filters: SOT?23*; Footprint: Package_TO_SOT_SMD:SOT-23; Supplier: http://www.ti.com/lit/ds/symlink/tps61322.pdf
footprint SOT-23
pins: 1 VOUT (power), 2 SW (power), 3 GND (power)